# Altium footprint library uControlador.PcbLib: 23 footprints (part 1 of 2)
Each footprint in its own frame and in the unit in brackets; x right, y up, seen from the top. Pads: shape width x height; smd on the part's side, far side on the other; paste and mask are expansions set on the pad; w line width, h text height; cw(c..) or ccw(c..) is an arc to the next point about the centre after c.
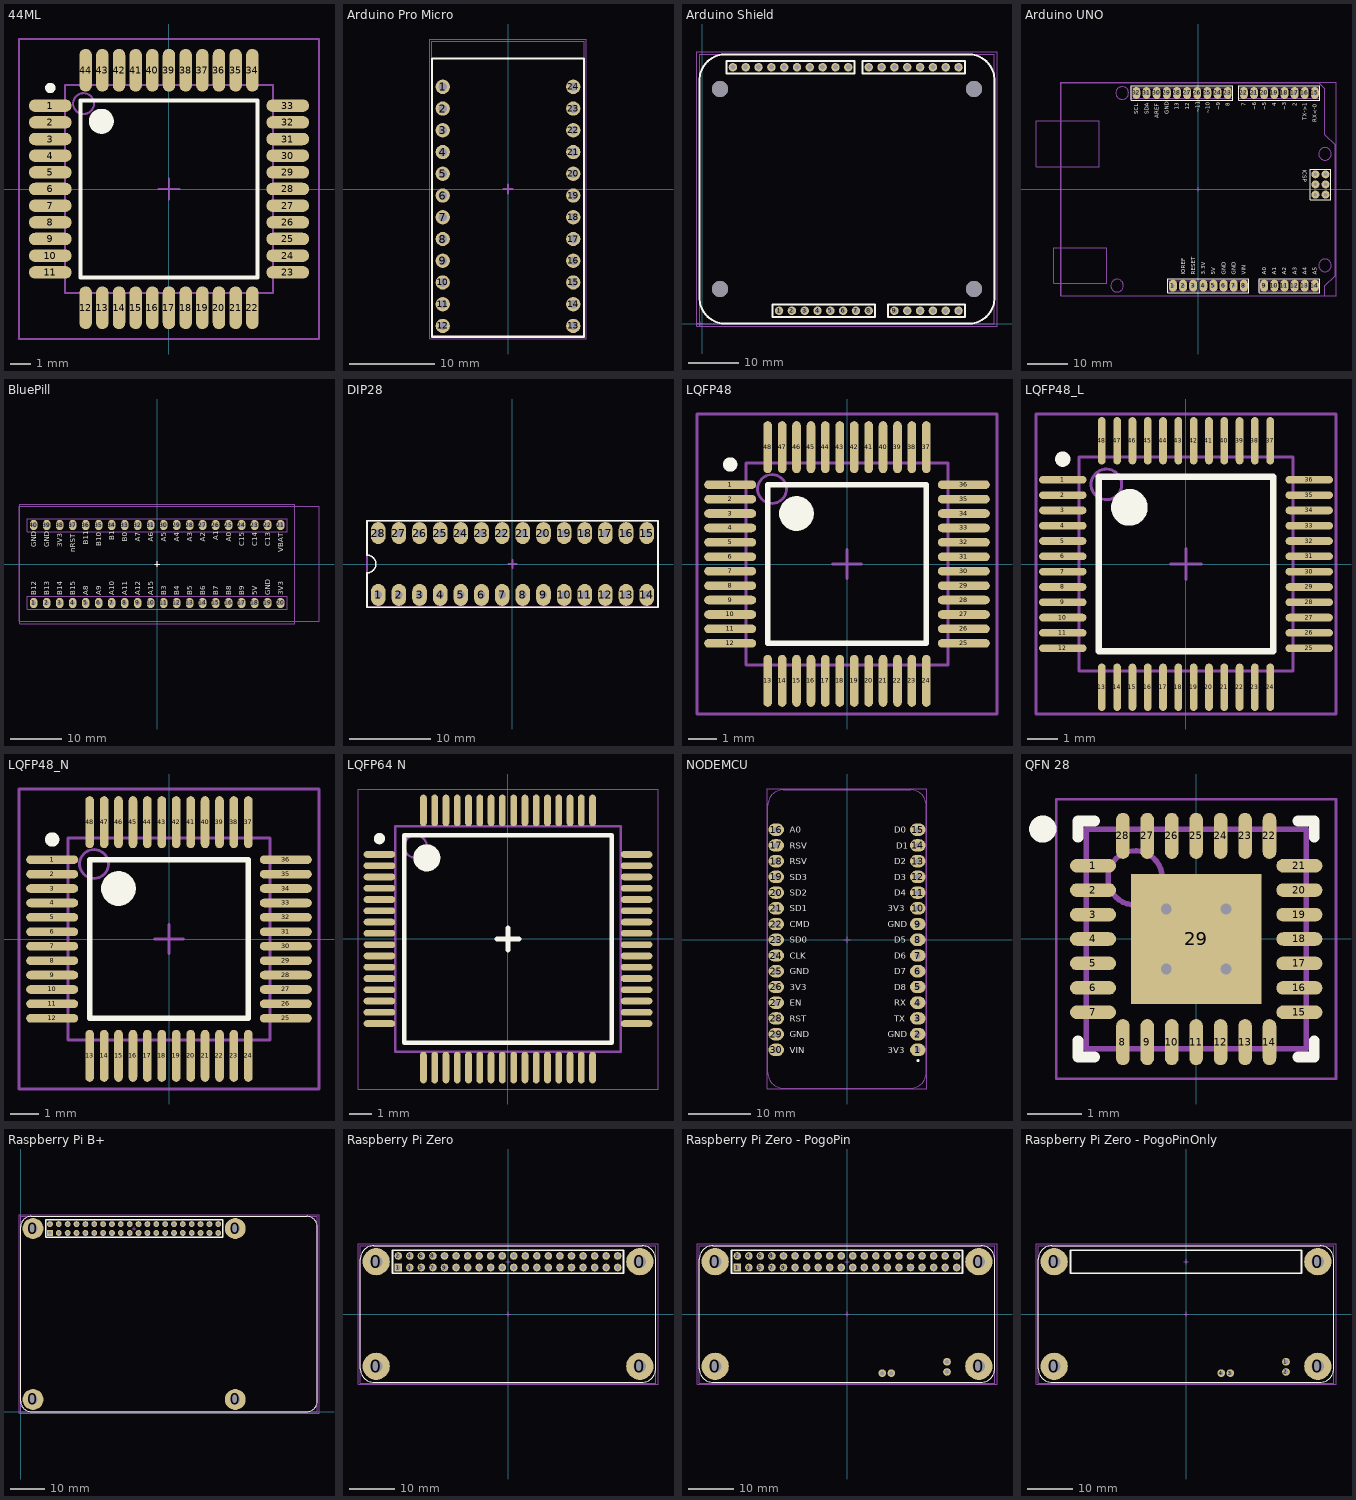
[diagram p0: the footprints below, top view; thin cyan lines are the x and y axes]

## 44ML [mm] "Thin QFP, 44-Leads, Body 10x10mm, Pitch 0.8mm, IPC Low Density"
height 1.2
pads (44):
  oval 2.05x0.6 smd: 1(-5.7,4) 2(-5.7,3.2) 3(-5.7,2.4) 4(-5.7,1.6) 5(-5.7,0.8) 6(-5.7,0) 7(-5.7,-0.8) 8(-5.7,-1.6) 9(-5.7,-2.4) 10(-5.7,-3.2) 11(-5.7,-4) 23(5.7,-4) 24(5.7,-3.2) 25(5.7,-2.4) 26(5.7,-1.6) 27(5.7,-0.8) 28(5.7,0) 29(5.7,0.8) 30(5.7,1.6) 31(5.7,2.4) 32(5.7,3.2) 33(5.7,4)
  oval 0.6x2.05 smd: 12(-4,-5.7) 13(-3.2,-5.7) 14(-2.4,-5.7) 15(-1.6,-5.7) 16(-0.8,-5.7) 17(0,-5.7) 18(0.8,-5.7) 19(1.6,-5.7) 20(2.4,-5.7) 21(3.2,-5.7) 22(4,-5.7) 34(4,5.7) 35(3.2,5.7) 36(2.4,5.7) 37(1.6,5.7) 38(0.8,5.7) 39(0,5.7) 40(-0.8,5.7) 41(-1.6,5.7) 42(-2.4,5.7) 43(-3.2,5.7) 44(-4,5.7)
Top Overlay:
  circle w0.6: c-3.25,3.25 r0.3
  circle w0.25: c-5.7,4.85 r0.125
  lines w0.2: -4.25,-4.25 4.25,-4.25 4.25,4.25 -4.25,4.25 -4.25,-4.25
Mechanical 13:
  circle w0.1: c-4.1,4.1 r0.5
  lines w0.1: -5,-5 5,-5 5,5 -5,5 -5,-5
Mechanical 15:
  lines w0.1: -0.5,0 0.5,0 ; 0,-0.5 0,0.5 ; -7.2,-7.2 7.2,-7.2 7.2,7.2 -7.2,7.2 -7.2,-7.2
3D body: height 1.2, standoff 0, extent -5,-5 5,5

## Arduino Pro Micro [mil]
pads (24):
  round 66 hole 39.37: 1(-300,470) 2(-300,370) 3(-300,270) 4(-300,170) 5(-300,70) 6(-300,-30) 7(-300,-130) 8(-300,-230) 9(-300,-330) 10(-300,-430) 11(-300,-530) 12(-300,-630) 13(300,-630) 14(300,-530) 15(300,-430) 16(300,-330) 17(300,-230) 18(300,-130) 19(300,-30) 20(300,70) 21(300,170) 22(300,270) 23(300,370) 24(300,470)
Top Overlay:
  lines w10: -350,-680 -350,600 350,600 350,-680 -350,-680
Mechanical 15:
  lines w3.94: -360,-690 -360,690 360,690 360,-690 -360,-690
  lines w10: -20,0 20,0 ; 0,-20 0,20
Mechanical 29:
  lines w3.94: -350,-680 -350,680 350,680 350,-680 -350,-680
  text ".Designator" at 680,170 h157.48
3D body "ARDUINO PRO MICRO.STEP": height 321.37, standoff -202.26, extent -350,-680 350,681.81

## Arduino Shield [mil]
pads (32):
  round 66 hole 39.37: 1(600,100) 2(700,100) 3(800,100) 4(900,100) 5(1000,100) 6(1100,100) 7(1200,100) 8(1300,100) 9(1500,100) 10(1600,100) 11(1700,100) 12(1800,100) 13(1900,100) 14(2000,100) 15(2000,2000) 16(1900,2000) 17(1800,2000) 18(1700,2000) 19(1600,2000) 20(1500,2000) 21(1400,2000) 22(1300,2000) 23(1140,2000) 24(1040,2000) 25(940,2000) 26(840,2000) 27(740,2000) 28(640,2000) 29(540,2000) 30(440,2000) 31(340,2000) 32(240,2000)
via 2120,270 diameter 125 hole 125
via 2120,1830 diameter 125 hole 125
via 140,1830 diameter 125 hole 125
via 140,270 diameter 125 hole 125
Top Overlay:
  lines w16: -20,200 ccw(c180,200) 180,0 2080,0 ccw(c2080,200) 2280,200 2280,1900 ccw(c2080,1900) 2080,2100 180,2100 ccw(c180,1900) -20,1900 -20,200 ; 190,1950 1190,1950 1190,2050 190,2050 190,1950 ; 550,50 550,150 1350,150 1350,50 550,50 ; 1250,1950 1250,2050 2050,2050 2050,1950 1250,1950 ; 1450,50 2050,50 2050,150 1450,150 1450,50
Mechanical 15:
  lines w3.94: -40,-20 -40,2120 2300,2120 2300,-20 -40,-20
  lines w10: -40,0 0,0 ; -20,-20 -20,20
Mechanical 29:
  lines w3.94: -20,0 -20,2100 2280,2100 2280,0 -20,0
  text ".Designator" at 1050,980 h157.48
3D body "User Library-SIL_Socket08_.STEP": height 334.65, standoff -411.79, extent 1250,1950 2050,2050
3D body "User Library-SIL_Socket10_.STEP": height 334.65, standoff -411.79, extent 190,1950 1190,2050
3D body "User Library-SIL_Socket08_.STEP": height 334.65, standoff -411.79, extent 550,50 1350,150
3D body "User Library-SIL_Socket06_.STEP": height 334.65, standoff -411.79, extent 1450,50 2050,150

## Arduino UNO [mm] "Arduino UNO"
height 14
pads (38):
  oval 2x3 hole 0.9: 1(-6.35,-24.13) 2(-3.81,-24.13) 3(-1.27,-24.13) 4(1.27,-24.13) 5(3.81,-24.13) 6(6.35,-24.13) 7(8.89,-24.13) 8(11.43,-24.13) 9(16.51,-24.13) 10(19.05,-24.13) 11(21.59,-24.13) 12(24.13,-24.13) 13(26.67,-24.13) 14(29.21,-24.13) 15(29.21,24.13) 16(26.67,24.13) 17(24.13,24.13) 18(21.59,24.13) 19(19.05,24.13) 20(16.51,24.13) 21(13.97,24.13) 22(11.43,24.13) 23(7.366,24.13) 24(4.826,24.13) 25(2.286,24.13) 26(-0.254,24.13) 27(-2.794,24.13) 28(-5.334,24.13) 29(-7.874,24.13) 30(-10.414,24.13) 31(-12.954,24.13) 32(-15.494,24.13)
  round 2 hole 0.9: 33(29.35,3.76) 34(29.35,1.22) 35(29.35,-1.32) 36(31.89,-1.32) 37(31.89,1.22) 38(31.89,3.76)
Top Overlay:
  lines w0.2: 33.172,0.161 33.172,5.029 ; 33.172,5.029 28.092,5.029 28.092,-2.591 33.172,-2.591 33.172,5.029 ; -16.764,22.352 -16.764,25.908 8.636,25.908 8.636,22.352 -16.764,22.352 ; -7.62,-25.908 12.7,-25.908 12.7,-22.352 -7.62,-22.352 -7.62,-25.908 ; 10.16,22.352 10.16,25.908 30.48,25.908 30.48,22.352 10.16,22.352 ; 15.24,-25.908 15.24,-22.352 30.48,-22.352 30.48,-25.908 15.24,-25.908
  text "~10" at 2.921,18.923 h1
  text "8" at 7.874,20.828 h1
  text "~9" at 5.461,19.812 h1
  text "12" at -2.286,19.939 h1
  text "~11" at 0.381,19.177 h1
  text "13" at -4.826,19.939 h1
  text "GND" at -7.366,18.796 h1
  text "AREF" at -9.906,17.78 h1
  text "SDA" at -12.446,18.796 h1
  text "SCL" at -14.986,18.796 h1
  text "RX<-0" at 29.718,16.764 h1
  text "2" at 24.638,20.828 h1
  text "TX->1" at 27.178,17.272 h1
  text "~3" at 22.098,19.812 h1
  text "4" at 19.558,20.828 h1
  text "~5" at 17.018,19.812 h1
  text "~6" at 14.478,19.812 h1
  text "7" at 11.938,20.828 h1
  text "A0" at 17.018,-21.463 h1
  text "A1" at 19.558,-21.463 h1
  text "A2" at 22.098,-21.463 h1
  text "A3" at 24.638,-21.463 h1
  text "A4" at 27.178,-21.463 h1
  text "A5" at 29.718,-21.463 h1
  text "VIN" at 11.938,-21.463 h1
  text "GND" at 9.398,-21.463 h1
  text "GND" at 6.858,-21.463 h1
  text "5V" at 4.318,-21.463 h1
  text "3.3V" at 1.778,-21.463 h1
  text "ICSP" at 26.162,4.953 h1
  text "IOREF" at -3.302,-21.463 h1
  text "RESET" at -0.762,-21.463 h1
Mechanical 13:
  circle w0.1: c-19.05,24.13 r1.587
  circle w0.1: c31.75,8.89 r1.587
  circle w0.1: c-20.32,-24.13 r1.587
  circle w0.1: c31.75,-19.05 r1.587
  lines w0.1: -40.64,5.715 -40.64,17.145 -24.765,17.145 -24.765,5.715 -40.64,5.715 ; -36.195,-23.495 -22.86,-23.495 -22.86,-14.605 -36.195,-14.605 -36.195,-23.495 ; -34.29,-26.67 -34.29,26.67 30.226,26.67 31.75,25.146 31.75,13.716 34.29,11.176 34.29,-21.59 31.75,-24.13 31.75,-26.67 -34.29,-26.67 ; -16.764,22.86 8.636,22.86 8.636,25.4 -16.764,25.4 -16.764,22.86 ; -7.62,-25.4 -7.62,-22.86 12.7,-22.86 12.7,-25.4 -7.62,-25.4 ; 10.16,22.86 30.48,22.86 30.48,25.4 10.16,25.4 10.16,22.86 ; 15.24,-25.4 30.48,-25.4 30.48,-22.86 15.24,-22.86 15.24,-25.4
  text "DC" at -30.099,-16.51 h3
  text "USB" at -30.988,15.494 h3
Mechanical 15:
  lines w0.05: -34.49,-26.67 34.51,-26.67 34.51,26.83 -34.49,26.83 -34.49,-26.67
  lines w0.1: -0.5,0 0.5,0 ; 0,-0.5 0,0.5
Mechanical 29:
  text ".Designator" at 0,0 h1.52
3D body "Arduino_UNO.STEP": height -1.6, standoff -16.85, extent -40.64,-26.67 34.29,26.67
3D body "User Library-SIL_Socket10_.STEP": height 8.5, standoff -10.46, extent -16.764,22.86 8.636,25.4
3D body "User Library-SIL_Socket08_.STEP": height 8.5, standoff -10.46, extent -7.62,-25.4 12.7,-22.86
3D body "User Library-SIL_Socket08_.STEP": height 8.5, standoff -10.46, extent 10.16,22.86 30.48,25.4
3D body "User Library-SIL_Socket06_.STEP": height 8.5, standoff -10.46, extent 15.24,-25.4 30.48,-22.86

## BluePill [mm] "BluePill"
height 19.68
pads (40):
  oval 1.5x2 hole 0.9: 1(-24.13,-7.62) 2(-21.59,-7.62) 3(-19.05,-7.62) 4(-16.51,-7.62) 5(-13.97,-7.62) 6(-11.43,-7.62) 7(-8.89,-7.62) 8(-6.35,-7.62) 9(-3.81,-7.62) 10(-1.27,-7.62) 11(1.27,-7.62) 12(3.81,-7.62) 13(6.35,-7.62) 14(8.89,-7.62) 15(11.43,-7.62) 16(13.97,-7.62) 17(16.51,-7.62) 18(19.05,-7.62) 19(21.59,-7.62) 20(24.13,-7.62) 21(24.13,7.62) 22(21.59,7.62) 23(19.05,7.62) 24(16.51,7.62) 25(13.97,7.62) 26(11.43,7.62) 27(8.89,7.62) 28(6.35,7.62) 29(3.81,7.62) 30(1.27,7.62) 31(-1.27,7.62) 32(-3.81,7.62) 33(-6.35,7.62) 34(-8.89,7.62) 35(-11.43,7.62) 36(-13.97,7.62) 37(-16.51,7.62) 38(-19.05,7.62) 39(-21.59,7.62) 40(-24.13,7.62)
Top Overlay:
  lines w0.2: -0.5,0 0.5,0 ; 0,-0.5 0,0.5
  text "B12" at -23.622,-6.096 h1
  text "B13" at -21.082,-6.096 h1
  text "B14" at -18.542,-6.096 h1
  text "B15" at -16.002,-6.096 h1
  text "A8" at -13.462,-6.096 h1
  text "A9" at -10.922,-6.096 h1
  text "A10" at -8.382,-6.096 h1
  text "A11" at -5.842,-6.096 h1
  text "A12" at -3.302,-6.096 h1
  text "A15" at -0.762,-6.096 h1
  text "B3" at 1.778,-6.096 h1
  text "B4" at 4.318,-6.096 h1
  text "3V3" at 24.638,-6.096 h1
  text "GND" at 22.098,-6.096 h1
  text "5V" at 19.558,-6.096 h1
  text "B9" at 17.018,-6.096 h1
  text "B8" at 14.478,-6.096 h1
  text "B7" at 11.938,-6.096 h1
  text "B6" at 9.398,-6.096 h1
  text "B5" at 6.858,-6.096 h1
  text "A3" at 6.858,4.302 h1
  text "A2" at 9.398,4.302 h1
  text "A1" at 11.938,4.635 h1
  text "A0" at 14.478,4.302 h1
  text "C15" at 17.018,3.469 h1
  text "C14" at 19.558,3.469 h1
  text "C13" at 22.098,3.469 h1
  text "VBAT" at 24.638,2.302 h1
  text "A4" at 4.318,4.302 h1
  text "A5" at 1.778,4.302 h1
  text "A6" at -0.762,4.302 h1
  text "A7" at -3.302,4.302 h1
  text "B0" at -5.842,4.302 h1
  text "B1" at -8.382,4.635 h1
  text "B10" at -10.922,3.469 h1
  text "B11" at -13.462,3.802 h1
  text "nRST" at -16.002,2.302 h1
  text "3V3" at -18.542,3.302 h1
  text "GND" at -21.082,3.302 h1
  text "GND" at -23.622,3.302 h1
Mechanical 13:
  lines w0.1: -27,-11.227 -27,11.273 31.648,11.273 31.648,-11.227 -27,-11.227 ; -25.4,-8.89 -25.4,-6.35 25.4,-6.35 25.4,-8.89 -25.4,-8.89 ; -25.4,6.35 25.4,6.35 25.4,8.89 -25.4,8.89 -25.4,6.35
Mechanical 15:
  lines w0.05: -26.9,-11.7 -26.9,11.7 26.9,11.7 26.9,-11.7 -26.9,-11.7
  lines w0.1: -0.5,0 0.5,0 ; 0,-0.5 0,0.5
Mechanical 29:
  text ".Designator" at 0,0 h1.52
3D body "BluePill.STEP": height 19.68, standoff -2.09, extent -26.988,-11.227 31.648,11.273

## DIP28 [mm]
pads (28):
  oval 1.8x2.7 hole 0.9: 1(-16.51,-3.8) 2(-13.97,-3.8) 3(-11.43,-3.8) 4(-8.89,-3.8) 5(-6.35,-3.8) 6(-3.81,-3.8) 7(-1.27,-3.8) 8(1.27,-3.8) 9(3.81,-3.8) 10(6.35,-3.8) 11(8.89,-3.8) 12(11.43,-3.8) 13(13.97,-3.8) 14(16.51,-3.8) 15(16.51,3.8) 16(13.97,3.8) 17(11.43,3.8) 18(8.89,3.8) 19(6.35,3.8) 20(3.81,3.8) 21(1.27,3.8) 22(-1.27,3.8) 23(-3.81,3.8) 24(-6.35,3.8) 25(-8.89,3.8) 26(-11.43,3.8) 27(-13.97,3.8) 28(-16.51,3.8)
Top Overlay:
  lines w0.2: -17.9,-5.3 17.9,-5.3 17.9,5.3 -17.9,5.3 -17.9,1.1 cw(c-17.9,0) -17.9,-1.1 -17.9,-5.3
Mechanical 15:
  lines w0.2: -0.5,0 0.5,0 ; 0,-0.5 0,0.5 ; -17.9,-5.3 -17.9,5.3 17.9,5.3 17.9,-5.3 -17.9,-5.3
Mechanical 29:
  text ".Designator" at -17.7,5.8 h0.5
  text "1" at -16.6,-2.1 h0.5
3D body "DIP28.STEP": height 8, standoff 0.7, extent -17.61,-3.935 17.59,3.935
3D body "SOCKET DIP28.STEP": height 4.19, standoff -3.09, extent -17.79,-5.1 17.77,5.06

## LQFP48 [mm] "LQFP48"
height 1.6
pads (48):
  oval 1.8x0.3 smd: 1(-4.05,2.75) 2(-4.05,2.25) 3(-4.05,1.75) 4(-4.05,1.25) 5(-4.05,0.75) 6(-4.05,0.25) 7(-4.05,-0.25) 8(-4.05,-0.75) 9(-4.05,-1.25) 10(-4.05,-1.75) 11(-4.05,-2.25) 12(-4.05,-2.75) 25(4.05,-2.75) 26(4.05,-2.25) 27(4.05,-1.75) 28(4.05,-1.25) 29(4.05,-0.75) 30(4.05,-0.25) 31(4.05,0.25) 32(4.05,0.75) 33(4.05,1.25) 34(4.05,1.75) 35(4.05,2.25) 36(4.05,2.75)
  oval 0.3x1.8 smd: 13(-2.75,-4.05) 14(-2.25,-4.05) 15(-1.75,-4.05) 16(-1.25,-4.05) 17(-0.75,-4.05) 18(-0.25,-4.05) 19(0.25,-4.05) 20(0.75,-4.05) 21(1.25,-4.05) 22(1.75,-4.05) 23(2.25,-4.05) 24(2.75,-4.05) 37(2.75,4.05) 38(2.25,4.05) 39(1.75,4.05) 40(1.25,4.05) 41(0.75,4.05) 42(0.25,4.05) 43(-0.25,4.05) 44(-0.75,4.05) 45(-1.25,4.05) 46(-1.75,4.05) 47(-2.25,4.05) 48(-2.75,4.05)
Top Overlay:
  circle w0.6: c-1.75,1.75 r0.3
  circle w0.25: c-4.05,3.45 r0.125
  lines w0.2: -2.75,-2.75 2.75,-2.75 2.75,2.75 -2.75,2.75 -2.75,-2.75
Mechanical 13:
  circle w0.1: c-2.6,2.6 r0.5
  lines w0.1: -3.5,-3.5 3.5,-3.5 3.5,3.5 -3.5,3.5 -3.5,-3.5
Mechanical 15:
  lines w0.1: -0.5,0 0.5,0 ; 0,-0.5 0,0.5 ; -5.2,-5.2 5.2,-5.2 5.2,5.2 -5.2,5.2 -5.2,-5.2
3D body "User Library-LQFP48_Grid_0_5.STEP": height 1.6, standoff 0, extent -4.5,-4.5 4.5,4.5

## LQFP48_L [mm] "Thin QFP, 48-Leads, Body 7x7mm, Pitch 0.5mm, IPC High Density"
height 1.6
pads (48):
  oval 1.55x0.25 smd: 1(-4.025,2.75) 2(-4.025,2.25) 3(-4.025,1.75) 4(-4.025,1.25) 5(-4.025,0.75) 6(-4.025,0.25) 7(-4.025,-0.25) 8(-4.025,-0.75) 9(-4.025,-1.25) 10(-4.025,-1.75) 11(-4.025,-2.25) 12(-4.025,-2.75) 25(4.025,-2.75) 26(4.025,-2.25) 27(4.025,-1.75) 28(4.025,-1.25) 29(4.025,-0.75) 30(4.025,-0.25) 31(4.025,0.25) 32(4.025,0.75) 33(4.025,1.25) 34(4.025,1.75) 35(4.025,2.25) 36(4.025,2.75)
  oval 0.25x1.55 smd: 13(-2.75,-4.025) 14(-2.25,-4.025) 15(-1.75,-4.025) 16(-1.25,-4.025) 17(-0.75,-4.025) 18(-0.25,-4.025) 19(0.25,-4.025) 20(0.75,-4.025) 21(1.25,-4.025) 22(1.75,-4.025) 23(2.25,-4.025) 24(2.75,-4.025) 37(2.75,4.025) 38(2.25,4.025) 39(1.75,4.025) 40(1.25,4.025) 41(0.75,4.025) 42(0.25,4.025) 43(-0.25,4.025) 44(-0.75,4.025) 45(-1.25,4.025) 46(-1.75,4.025) 47(-2.25,4.025) 48(-2.75,4.025)
Top Overlay:
  circle w0.6: c-1.85,1.85 r0.3
  circle w0.25: c-4.025,3.425 r0.125
  lines w0.2: -2.85,-2.85 2.85,-2.85 2.85,2.85 -2.85,2.85 -2.85,-2.85
Mechanical 13:
  circle w0.1: c-2.6,2.6 r0.5
  lines w0.1: -3.5,-3.5 3.5,-3.5 3.5,3.5 -3.5,3.5 -3.5,-3.5
Mechanical 15:
  lines w0.1: -0.5,0 0.5,0 ; 0,-0.5 0,0.5 ; -4.9,-4.9 4.9,-4.9 4.9,4.9 -4.9,4.9 -4.9,-4.9
3D body "User Library-sot313-2.STEP": height 1.5, standoff -0.04, extent -4.503,-4.506 4.503,4.5

## LQFP48_N [mm] "Thin QFP, 48-Leads, Body 7x7mm, Pitch 0.5mm, IPC Medium Density"
height 1.6
pads (48):
  oval 1.8x0.3 smd: 1(-4.05,2.75) 2(-4.05,2.25) 3(-4.05,1.75) 4(-4.05,1.25) 5(-4.05,0.75) 6(-4.05,0.25) 7(-4.05,-0.25) 8(-4.05,-0.75) 9(-4.05,-1.25) 10(-4.05,-1.75) 11(-4.05,-2.25) 12(-4.05,-2.75) 25(4.05,-2.75) 26(4.05,-2.25) 27(4.05,-1.75) 28(4.05,-1.25) 29(4.05,-0.75) 30(4.05,-0.25) 31(4.05,0.25) 32(4.05,0.75) 33(4.05,1.25) 34(4.05,1.75) 35(4.05,2.25) 36(4.05,2.75)
  oval 0.3x1.8 smd: 13(-2.75,-4.05) 14(-2.25,-4.05) 15(-1.75,-4.05) 16(-1.25,-4.05) 17(-0.75,-4.05) 18(-0.25,-4.05) 19(0.25,-4.05) 20(0.75,-4.05) 21(1.25,-4.05) 22(1.75,-4.05) 23(2.25,-4.05) 24(2.75,-4.05) 37(2.75,4.05) 38(2.25,4.05) 39(1.75,4.05) 40(1.25,4.05) 41(0.75,4.05) 42(0.25,4.05) 43(-0.25,4.05) 44(-0.75,4.05) 45(-1.25,4.05) 46(-1.75,4.05) 47(-2.25,4.05) 48(-2.75,4.05)
Top Overlay:
  circle w0.25: c-4.05,3.45 r0.125
  circle w0.6: c-1.75,1.75 r0.3
  lines w0.2: -2.75,-2.75 -2.75,2.75 2.75,2.75 2.75,-2.75 -2.75,-2.75
Mechanical 13:
  circle w0.1: c-2.6,2.6 r0.5
  lines w0.1: -3.5,-3.5 -3.5,3.5 3.5,3.5 3.5,-3.5 -3.5,-3.5
Mechanical 15:
  lines w0.1: -0.5,0 0.5,0 ; 0,-0.5 0,0.5 ; -5.2,-5.2 -5.2,5.2 5.2,5.2 5.2,-5.2 -5.2,-5.2
3D body "User Library-LQFP48_Grid_0_5.STEP": height 1.6, standoff 0, extent -4.5,-4.5 4.5,4.5

## LQFP64 N [mm] "TSQFP, 64-Leads, Body 10,00x10,00mm, Pitch 0,50mm, IPC Medium Density"
height 1.6
pads (64):
  oval 1.4x0.3 smd: 1(-5.7,3.75) 2(-5.7,3.25) 3(-5.7,2.75) 4(-5.7,2.25) 5(-5.7,1.75) 6(-5.7,1.25) 7(-5.7,0.75) 8(-5.7,0.25) 9(-5.7,-0.25) 10(-5.7,-0.75) 11(-5.7,-1.25) 12(-5.7,-1.75) 13(-5.7,-2.25) 14(-5.7,-2.75) 15(-5.7,-3.25) 16(-5.7,-3.75) 33(5.7,-3.75) 34(5.7,-3.25) 35(5.7,-2.75) 36(5.7,-2.25) 37(5.7,-1.75) 38(5.7,-1.25) 39(5.7,-0.75) 40(5.7,-0.25) 41(5.7,0.25) 42(5.7,0.75) 43(5.7,1.25) 44(5.7,1.75) 45(5.7,2.25) 46(5.7,2.75) 47(5.7,3.25) 48(5.7,3.75)
  oval 0.3x1.4 smd: 17(-3.75,-5.7) 18(-3.25,-5.7) 19(-2.75,-5.7) 20(-2.25,-5.7) 21(-1.75,-5.7) 22(-1.25,-5.7) 23(-0.75,-5.7) 24(-0.25,-5.7) 25(0.25,-5.7) 26(0.75,-5.7) 27(1.25,-5.7) 28(1.75,-5.7) 29(2.25,-5.7) 30(2.75,-5.7) 31(3.25,-5.7) 32(3.75,-5.7) 49(3.75,5.7) 50(3.25,5.7) 51(2.75,5.7) 52(2.25,5.7) 53(1.75,5.7) 54(1.25,5.7) 55(0.75,5.7) 56(0.25,5.7) 57(-0.25,5.7) 58(-0.75,5.7) 59(-1.25,5.7) 60(-1.75,5.7) 61(-2.25,5.7) 62(-2.75,5.7) 63(-3.25,5.7) 64(-3.75,5.7)
Top Overlay:
  circle w0.6: c-3.6,3.6 r0.3
  circle w0.25: c-5.7,4.45 r0.125
  lines w0.2: -0.5,0 0.5,0 ; 0,-0.5 0,0.5 ; -4.6,-4.6 4.6,-4.6 4.6,4.6 -4.6,4.6 -4.6,-4.6
Mechanical 13:
  circle w0.1: c-4.1,4.1 r0.5
  lines w0.1: -5,-5 5,-5 5,5 -5,5 -5,-5
Mechanical 15:
  lines w0.05: -6.65,-6.65 6.65,-6.65 6.65,6.65 -6.65,6.65 -6.65,-6.65
  lines w0.1: -0.5,0 0.5,0 ; 0,-0.5 0,0.5
Mechanical 29:
  text ".Designator" at 0,0 h1
3D body "TSQFP50P1200X1200X160-64N.step": height 1.6, standoff 0, extent -6,-6 6,6

## NODEMCU [mm]
height 7.74
pads (30):
  oval 2.5x2 hole 0.9: 1(11.43,-17.78) 2(11.43,-15.24) 3(11.43,-12.7) 4(11.43,-10.16) 5(11.43,-7.62) 6(11.43,-5.08) 7(11.43,-2.54) 8(11.43,0) 9(11.43,2.54) 10(11.43,5.08) 11(11.43,7.62) 12(11.43,10.16) 13(11.43,12.7) 14(11.43,15.24) 15(11.43,17.78) 16(-11.43,17.78) 17(-11.43,15.24) 18(-11.43,12.7) 19(-11.43,10.16) 20(-11.43,7.62) 21(-11.43,5.08) 22(-11.43,2.54) 23(-11.43,0) 24(-11.43,-2.54) 25(-11.43,-5.08) 26(-11.43,-7.62) 27(-11.43,-10.16) 28(-11.43,-12.7) 29(-11.43,-15.24) 30(-11.43,-17.78)
Top Overlay:
  circle w0.25: c11.482,-19.52 r0.125
  text "3V3" at 6.62,-18.288 h1
  text "GND" at 6.62,-15.748 h1
  text "TX" at 7.62,-13.208 h1
  text "RX" at 7.62,-10.668 h1
  text "D8" at 7.62,-8.128 h1
  text "D7" at 7.62,-5.588 h1
  text "D6" at 7.62,-3.048 h1
  text "D5" at 7.62,-0.508 h1
  text "3V3" at 6.62,4.572 h1
  text "GND" at 6.62,2.032 h1
  text "D4" at 7.62,7.112 h1
  text "D3" at 7.62,9.652 h1
  text "D2" at 7.62,12.192 h1
  text "D1" at 7.953,14.732 h1
  text "D0" at 7.62,17.272 h1
  text "A0" at -9.271,17.272 h1
  text "RSV" at -9.271,14.732 h1
  text "RSV" at -9.271,12.192 h1
  text "SD3" at -9.271,9.652 h1
  text "SD2" at -9.271,7.112 h1
  text "CMD" at -9.271,2.032 h1
  text "SD1" at -9.271,4.572 h1
  text "SD0" at -9.271,-0.508 h1
  text "CLK" at -9.271,-3.048 h1
  text "GND" at -9.271,-5.588 h1
  text "3V3" at -9.271,-8.128 h1
  text "EN" at -9.271,-10.668 h1
  text "RST" at -9.271,-13.208 h1
  text "GND" at -9.271,-15.748 h1
  text "VIN" at -9.271,-18.288 h1
Mechanical 13:
  lines w0.1: -12.775,-21.471 ccw(c-10.275,-21.471) -10.275,-23.971 10.275,-23.971 ccw(c10.275,-21.471) 12.775,-21.471 12.775,21.72 ccw(c10.275,21.72) 10.275,24.22 -10.275,24.22 ccw(c-10.275,21.72) -12.775,21.72 -12.775,-21.471
Mechanical 15:
  lines w0.05: -12.9,-24.1 12.9,-24.1 12.9,24.35 -12.9,24.35 -12.9,-24.1
  lines w0.1: -0.5,0 0.5,0 ; 0,-0.5 0,0.5
Mechanical 29:
  text ".Designator" at 0,-0.191 h1.52
3D body "ESP8266 v7.stp": height 7.74, standoff -6.35, extent -12.775,-24.6 12.775,24.22

## QFN 28 [mm] "QFN, 28-Leads, Body 4,00x4,00mm, Pitch 0,45mm, Thermal Pad 2,40x2,40mm, IPC Medium Density"
height 1
pads (29):
  oval 0.85x0.25 smd: 1(-1.9,1.35) 2(-1.9,0.9) 3(-1.9,0.45) 4(-1.9,0) 5(-1.9,-0.45) 6(-1.9,-0.9) 7(-1.9,-1.35) 15(1.9,-1.35) 16(1.9,-0.9) 17(1.9,-0.45) 18(1.9,0) 19(1.9,0.45) 20(1.9,0.9) 21(1.9,1.35)
  oval 0.25x0.85 smd: 8(-1.35,-1.9) 9(-0.9,-1.9) 10(-0.45,-1.9) 11(0,-1.9) 12(0.45,-1.9) 13(0.9,-1.9) 14(1.35,-1.9) 22(1.35,1.9) 23(0.9,1.9) 24(0.45,1.9) 25(0,1.9) 26(-0.45,1.9) 27(-0.9,1.9) 28(-1.35,1.9)
  rect 2.4x2.4 smd: 29(0,0)
via 0.55,-0.55 diameter 0.5 hole 0.2
via -0.55,-0.55 diameter 0.5 hole 0.2
via 0.55,0.55 diameter 0.5 hole 0.2
via -0.55,0.55 diameter 0.5 hole 0.2
Top Overlay:
  circle w0.25: c-2.825,2.025 r0.125
  lines w0.2: -2.175,-1.875 -2.175,-2.175 -1.875,-2.175 ; -2.175,1.875 -2.175,2.175 -1.875,2.175 ; 1.875,-2.175 2.175,-2.175 2.175,-1.875 ; 1.875,2.175 2.175,2.175 2.175,1.875
Mechanical 13:
  circle w0.1: c-1.125,1.125 r0.5
  lines w0.1: -2.025,-2.025 2.025,-2.025 2.025,2.025 -2.025,2.025 -2.025,-2.025
Mechanical 15:
  lines w0.05: -2.575,-2.575 2.575,-2.575 2.575,2.575 -2.575,2.575 -2.575,-2.575
  lines w0.1: -0.5,0 0.5,0 ; 0,-0.5 0,0.5
3D body: height 1, standoff 0, extent -2.025,-2.025 2.025,2.025

## Raspberry Pi B+ [mm]
pads (44):
  round 6 hole 2.75: 0(3.5,3.5) 0(3.5,52.5) 0(61.5,3.5) 0(61.5,52.5)
  rect 1.676x1.676 hole 1: 1(8.37,51.23)
  round 1.676 hole 1: 2(8.37,53.77) 3(10.91,51.23) 4(10.91,53.77) 5(13.45,51.23) 6(13.45,53.77) 7(15.99,51.23) 8(15.99,53.77) 9(18.53,51.23) 10(18.53,53.77) 11(21.07,51.23) 12(21.07,53.77) 13(23.61,51.23) 14(23.61,53.77) 15(26.15,51.23) 16(26.15,53.77) 17(28.69,51.23) 18(28.69,53.77) 19(31.23,51.23) 20(31.23,53.77) 21(33.77,51.23) 22(33.77,53.77) 23(36.31,51.23) 24(36.31,53.77) 25(38.85,51.23) 26(38.85,53.77) 27(41.39,51.23) 28(41.39,53.77) 29(43.93,51.23) 30(43.93,53.77) 31(46.47,51.23) 32(46.47,53.77) 33(49.01,51.23) 34(49.01,53.77) 35(51.55,51.23) 36(51.55,53.77) 37(54.09,51.23) 38(54.09,53.77) 39(56.63,51.23) 40(56.63,53.77)
Top Overlay:
  lines w0.254: 0,3 ccw(c3,3) 3,0 82,0 ccw(c82,3) 85,3 85,53 ccw(c82,53) 82,56 3,56 ccw(c3,53) 0,53 0,3
  lines w0.406: 7.1,49.96 27.42,49.96 57.9,49.96 57.9,55.04 7.1,55.04 7.1,52.5 7.1,49.96
Mechanical 1:
  lines w0.254: 31.992,52.5 33.008,52.5 ; 32.5,51.992 32.5,53.008
Mechanical 15:
  lines w0.1: -0.5,-0.5 85.5,-0.5 85.5,56.5 -0.5,56.5 -0.5,-0.5
Mechanical 29:
  lines w0.1: 0,0 85,0 85,56 0,56 0,0
  text ".Designator" at 23,26 h4
3D body "RaspB+.step": height 26.45, standoff 1.11, extent 0.125,-1.6 87.375,56

## Raspberry Pi Zero [mm]
pads (44):
  round 6 hole 2.75: 0(-29,-11.5) 0(-29,11.5) 0(29,-11.5) 0(29,11.5)
  rect 1.676x1.676 hole 1: 1(-24.13,10.23)
  round 1.676 hole 1: 2(-24.13,12.77) 3(-21.59,10.23) 4(-21.59,12.77) 5(-19.05,10.23) 6(-19.05,12.77) 7(-16.51,10.23) 8(-16.51,12.77) 9(-13.97,10.23) 10(-13.97,12.77) 11(-11.43,10.23) 12(-11.43,12.77) 13(-8.89,10.23) 14(-8.89,12.77) 15(-6.35,10.23) 16(-6.35,12.77) 17(-3.81,10.23) 18(-3.81,12.77) 19(-1.27,10.23) 20(-1.27,12.77) 21(1.27,10.23) 22(1.27,12.77) 23(3.81,10.23) 24(3.81,12.77) 25(6.35,10.23) 26(6.35,12.77) 27(8.89,10.23) 28(8.89,12.77) 29(11.43,10.23) 30(11.43,12.77) 31(13.97,10.23) 32(13.97,12.77) 33(16.51,10.23) 34(16.51,12.77) 35(19.05,10.23) 36(19.05,12.77) 37(21.59,10.23) 38(21.59,12.77) 39(24.13,10.23) 40(24.13,12.77)
Top Overlay:
  lines w0.254: -32.5,-12 ccw(c-29.5,-12) -29.5,-15 29.5,-15 ccw(c29.5,-12) 32.5,-12 32.5,12 ccw(c29.5,12) 29.5,15 -29.5,15 ccw(c-29.5,12) -32.5,12 -32.5,-12
  lines w0.406: -25.4,8.96 -5.08,8.96 25.4,8.96 25.4,14.04 -25.4,14.04 -25.4,11.5 -25.4,8.96
Mechanical 1:
  lines w0.254: -0.508,11.5 0.508,11.5 ; 0,10.992 0,12.008
Mechanical 15:
  lines w0.1: -33,-15.5 33,-15.5 33,15.5 -33,15.5 -33,-15.5
  lines w0.254: -0.5,0 0.5,0 ; 0,-0.516 0,0.5
Mechanical 29:
  lines w0.1: -32.5,-15.25 32.5,-15.25 32.5,15 -32.5,15 -32.5,-15.25
  text ".Designator" at -17.25,-1.5 h4
3D body "RaspZero.step": height 14.21, standoff 1.11, extent -32.5,-15.25 32.5,15.23

## Raspberry Pi Zero - PogoPin [mm]
pads (48):
  round 6 hole 2.75: 0(-29,-11.5) 0(-29,11.5) 0(29,-11.5) 0(29,11.5)
  rect 1.676x1.676 hole 1: 1(-24.13,10.23)
  round 1.676 hole 1: 2(-24.13,12.77) 3(-21.59,10.23) 4(-21.59,12.77) 5(-19.05,10.23) 6(-19.05,12.77) 7(-16.51,10.23) 8(-16.51,12.77) 9(-13.97,10.23) 10(-13.97,12.77) 11(-11.43,10.23) 12(-11.43,12.77) 13(-8.89,10.23) 14(-8.89,12.77) 15(-6.35,10.23) 16(-6.35,12.77) 17(-3.81,10.23) 18(-3.81,12.77) 19(-1.27,10.23) 20(-1.27,12.77) 21(1.27,10.23) 22(1.27,12.77) 23(3.81,10.23) 24(3.81,12.77) 25(6.35,10.23) 26(6.35,12.77) 27(8.89,10.23) 28(8.89,12.77) 29(11.43,10.23) 30(11.43,12.77) 31(13.97,10.23) 32(13.97,12.77) 33(16.51,10.23) 34(16.51,12.77) 35(19.05,10.23) 36(19.05,12.77) 37(21.59,10.23) 38(21.59,12.77) 39(24.13,10.23) 40(24.13,12.77) 41(22,-10.5) 42(22,-12.75) 43(9.75,-13) 44(7.75,-13)
Top Overlay:
  lines w0.254: -32.5,-12 ccw(c-29.5,-12) -29.5,-15 29.5,-15 ccw(c29.5,-12) 32.5,-12 32.5,12 ccw(c29.5,12) 29.5,15 -29.5,15 ccw(c-29.5,12) -32.5,12 -32.5,-12
  lines w0.406: -25.4,8.96 -25.4,11.5 -25.4,14.04 25.4,14.04 25.4,8.96 -5.08,8.96 -25.4,8.96
Mechanical 1:
  lines w0.254: -0.508,11.5 0.508,11.5 ; 0,10.992 0,12.008
Mechanical 15:
  lines w0.1: -33,-15.5 -33,15.5 33,15.5 33,-15.5 -33,-15.5
  lines w0.254: -0.5,0 0.5,0 ; 0,-0.516 0,0.5
Mechanical 29:
  lines w0.1: -32.5,-15.25 -32.5,15 32.5,15 32.5,-15.25 -32.5,-15.25
  text ".Designator" at -17.25,-1.5 h4
3D body "RaspZero.step": height 14.21, standoff 1.11, extent -32.5,-15.25 32.5,15.23

## Raspberry Pi Zero - PogoPinOnly [mm]
pads (8):
  round 6 hole 2.75: 0(-29,-11.5) 0(-29,11.5) 0(29,-11.5) 0(29,11.5)
  round 1.676 hole 1: 1(22,-10.5) 2(22,-12.75) 3(9.75,-13) 4(7.75,-13)
Top Overlay:
  lines w0.254: -32.5,-12 ccw(c-29.5,-12) -29.5,-15 29.5,-15 ccw(c29.5,-12) 32.5,-12 32.5,12 ccw(c29.5,12) 29.5,15 -29.5,15 ccw(c-29.5,12) -32.5,12 -32.5,-12
  lines w0.406: -25.4,8.96 -25.4,11.5 -25.4,14.04 25.4,14.04 25.4,8.96 -5.08,8.96 -25.4,8.96
Mechanical 1:
  lines w0.254: -0.508,11.5 0.508,11.5 ; 0,10.992 0,12.008
Mechanical 15:
  lines w0.1: -33,-15.5 -33,15.5 33,15.5 33,-15.5 -33,-15.5
  lines w0.254: -0.5,0 0.5,0 ; 0,-0.516 0,0.5
Mechanical 29:
  lines w0.1: -32.5,-15.25 -32.5,15 32.5,15 32.5,-15.25 -32.5,-15.25
  text ".Designator" at -17.25,-1.5 h4
3D body "RaspZero.step": height 12.71, standoff -0.39, extent -32.5,-15.25 32.5,15.23